# Altium footprint library ThanhNT.PcbLib: 579 footprints (part 20 of 37)
Each footprint in its own frame and in the unit in brackets; x right, y up, seen from the top. Pads: shape width x height; smd on the part's side, far side on the other; paste and mask are expansions set on the pad; w line width, h text height; cw(c..) or ccw(c..) is an arc to the next point about the centre after c.
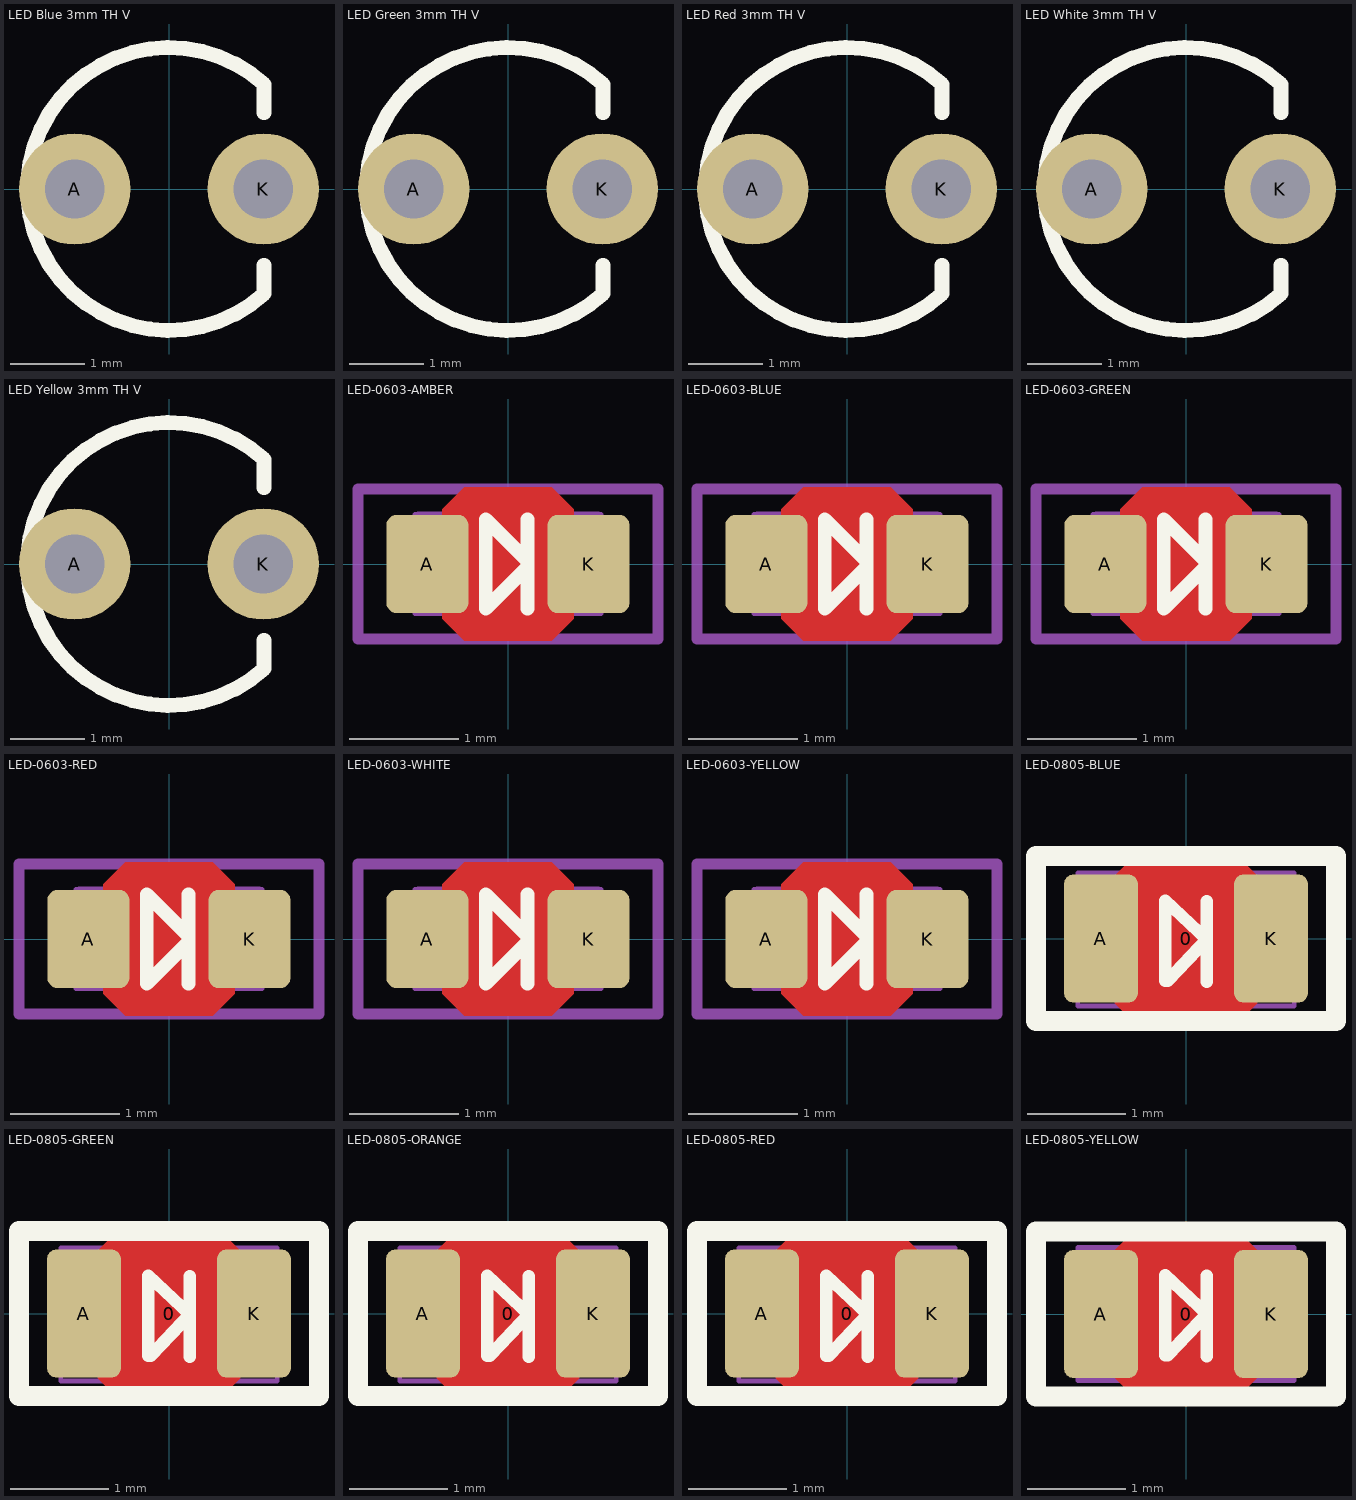
[diagram p19: the footprints below, top view; thin cyan lines are the x and y axes]

## LED Blue 3mm TH V [mm] "LED Blue 3mm TH V"
height 7.5
pads (2):
  round 1.5 hole 0.8: A(-1.27,0) K(1.27,0)
Top Overlay:
  lines w0.2: 1.281,-1.027 1.281,-1.41 cw(c0,0) 1.281,1.41 1.281,1.027
3D body "LED 3mm TH Blue.STEP": height 6.6, standoff -3.1, extent -1.6,-1.6 1.5,1.6

## LED Green 3mm TH V [mm] "LED Green 3mm TH V"
height 7.5
pads (2):
  round 1.5 hole 0.8: A(-1.27,0) K(1.27,0)
Top Overlay:
  lines w0.2: 1.281,-1.027 1.281,-1.41 cw(c0,0) 1.281,1.41 1.281,1.027
3D body "LED 3mm TH Green.STEP": height 6.6, standoff -3.1, extent -1.6,-1.6 1.5,1.6

## LED Red 3mm TH V [mm] "LED Red 3mm TH V"
height 7.5
pads (2):
  round 1.5 hole 0.8: A(-1.27,0) K(1.27,0)
Top Overlay:
  lines w0.2: 1.281,-1.027 1.281,-1.41 cw(c0,0) 1.281,1.41 1.281,1.027
3D body "LED 3mm TH Red.STEP": height 6.6, standoff -3.1, extent -1.6,-1.6 1.5,1.6

## LED White 3mm TH V [mm] "LED White 3mm TH V"
height 7.5
pads (2):
  round 1.5 hole 0.8: A(-1.27,0) K(1.27,0)
Top Overlay:
  lines w0.2: 1.281,-1.027 1.281,-1.41 cw(c0,0) 1.281,1.41 1.281,1.027
3D body "LED 3mm TH White.STEP": height 6.6, standoff -3.1, extent -1.6,-1.6 1.5,1.6

## LED Yellow 3mm TH V [mm] "LED Yellow 3mm TH V"
height 7.5
pads (2):
  round 1.5 hole 0.8: A(-1.27,0) K(1.27,0)
Top Overlay:
  lines w0.2: 1.281,-1.027 1.281,-1.41 cw(c0,0) 1.281,1.41 1.281,1.027
3D body "LED 3mm TH Yellow.STEP": height 6.6, standoff -3.1, extent -1.6,-1.6 1.5,1.6

## LED-0603-AMBER [mm]
height 0.8
pads (2):
  rrect25% 0.75x0.9 smd: A(-0.737,0) K(0.737,0)
Top Layer:
  pour cut-out: -0.6,0.5 -0.4,0.7 0.4,0.7 0.6,0.5 0.6,-0.5 0.4,-0.7 -0.4,-0.7 -0.6,-0.5
Top Overlay:
  lines w0.127: 0.178,-0.025 -0.203,-0.406 -0.203,0.406 0.178,0.025 0.178,-0.406 0.178,0.406
Mechanical 13:
  lines w0.05: -0.55,-0.43 0.55,-0.43 ; -0.55,0.43 0.55,0.43 ; -0.85,-0.45 -0.85,0.45 -0.55,0.45 -0.55,-0.45 -0.85,-0.45 ; 0.55,-0.45 0.55,0.45 0.85,0.45 0.85,-0.45 0.55,-0.45
Mechanical 15:
  lines w0.1: -1.372,-0.686 -1.372,0.686 1.372,0.686 1.372,-0.686 -1.372,-0.686
Mechanical 16:
  rectangle: 0.336,-0.472 0.836,0.478
  rectangle: -0.832,-0.472 -0.332,0.478
  lines w0.102: -0.35,-0.421 0.362,-0.421 ; -0.35,0.43 0.362,0.43
3D body "LED 0603 APT1608 AMBER.STEP": height 0.75, standoff 0, extent -0.8,-0.4 0.8,0.4

## LED-0603-BLUE [mm]
height 0.8
pads (2):
  rrect25% 0.75x0.9 smd: A(-0.737,0) K(0.737,0)
Top Layer:
  pour cut-out: -0.6,0.5 -0.4,0.7 0.4,0.7 0.6,0.5 0.6,-0.5 0.4,-0.7 -0.4,-0.7 -0.6,-0.5
Top Overlay:
  lines w0.127: 0.178,-0.025 -0.203,-0.406 -0.203,0.406 0.178,0.025 0.178,-0.406 0.178,0.406
Mechanical 13:
  lines w0.05: -0.55,-0.43 0.55,-0.43 ; -0.55,0.43 0.55,0.43 ; -0.85,-0.45 -0.55,-0.45 -0.55,0.45 -0.85,0.45 -0.85,-0.45 ; 0.55,-0.45 0.85,-0.45 0.85,0.45 0.55,0.45 0.55,-0.45
Mechanical 15:
  lines w0.1: -1.372,-0.686 1.372,-0.686 1.372,0.686 -1.372,0.686 -1.372,-0.686
Mechanical 16:
  rectangle: -0.832,-0.472 -0.332,0.478
  rectangle: 0.336,-0.472 0.836,0.478
  lines w0.102: -0.35,-0.421 0.362,-0.421 ; -0.35,0.43 0.362,0.43
3D body "LED 0603 APT1608 BLUE.STEP": height 0.75, standoff 0, extent -0.8,-0.4 0.8,0.4

## LED-0603-GREEN [mm]
height 0.8
pads (2):
  rrect25% 0.75x0.9 smd: A(-0.737,0) K(0.737,0)
Top Layer:
  pour cut-out: -0.6,0.5 -0.4,0.7 0.4,0.7 0.6,0.5 0.6,-0.5 0.4,-0.7 -0.4,-0.7 -0.6,-0.5
Top Overlay:
  lines w0.127: 0.178,-0.025 -0.203,-0.406 -0.203,0.406 0.178,0.025 0.178,-0.406 0.178,0.406
Mechanical 13:
  lines w0.05: -0.55,-0.43 0.55,-0.43 ; -0.55,0.43 0.55,0.43 ; -0.85,-0.45 -0.55,-0.45 -0.55,0.45 -0.85,0.45 -0.85,-0.45 ; 0.55,-0.45 0.85,-0.45 0.85,0.45 0.55,0.45 0.55,-0.45
Mechanical 15:
  lines w0.1: -1.372,-0.686 -1.372,0.686 1.372,0.686 1.372,-0.686 -1.372,-0.686
Mechanical 16:
  rectangle: -0.832,-0.472 -0.332,0.478
  rectangle: 0.336,-0.472 0.836,0.478
  lines w0.102: -0.35,-0.421 0.362,-0.421 ; -0.35,0.43 0.362,0.43
3D body "LED 0603 APT1608 GREEN.STEP": height 0.75, standoff 0, extent -0.8,-0.4 0.8,0.4

## LED-0603-RED [mm]
height 0.8
pads (2):
  rrect25% 0.75x0.9 smd: A(-0.737,0) K(0.737,0)
Top Layer:
  pour cut-out: -0.6,0.5 -0.4,0.7 0.4,0.7 0.6,0.5 0.6,-0.5 0.4,-0.7 -0.4,-0.7 -0.6,-0.5
Top Overlay:
  lines w0.127: 0.178,-0.025 -0.203,-0.406 -0.203,0.406 0.178,0.025 0.178,-0.406 0.178,0.406
Mechanical 13:
  lines w0.05: -0.55,-0.43 0.55,-0.43 ; -0.55,0.43 0.55,0.43 ; -0.85,-0.45 -0.85,0.45 -0.55,0.45 -0.55,-0.45 -0.85,-0.45 ; 0.55,-0.45 0.55,0.45 0.85,0.45 0.85,-0.45 0.55,-0.45
Mechanical 15:
  lines w0.1: -1.372,-0.686 -1.372,0.686 1.372,0.686 1.372,-0.686 -1.372,-0.686
Mechanical 16:
  rectangle: 0.336,-0.472 0.836,0.478
  rectangle: -0.832,-0.472 -0.332,0.478
  lines w0.102: -0.35,-0.421 0.362,-0.421 ; -0.35,0.43 0.362,0.43
3D body "LED 0603 APT1608 RED.STEP": height 0.75, standoff 0, extent -0.8,-0.4 0.8,0.4

## LED-0603-WHITE [mm]
height 0.8
pads (2):
  rrect25% 0.75x0.9 smd: A(-0.737,0) K(0.737,0)
Top Layer:
  pour cut-out: -0.6,0.5 -0.4,0.7 0.4,0.7 0.6,0.5 0.6,-0.5 0.4,-0.7 -0.4,-0.7 -0.6,-0.5
Top Overlay:
  lines w0.127: 0.178,-0.025 -0.203,-0.406 -0.203,0.406 0.178,0.025 0.178,-0.406 0.178,0.406
Mechanical 13:
  lines w0.05: -0.55,-0.43 0.55,-0.43 ; -0.55,0.43 0.55,0.43 ; -0.85,-0.45 -0.55,-0.45 -0.55,0.45 -0.85,0.45 -0.85,-0.45 ; 0.55,-0.45 0.85,-0.45 0.85,0.45 0.55,0.45 0.55,-0.45
Mechanical 15:
  lines w0.1: -1.372,-0.686 1.372,-0.686 1.372,0.686 -1.372,0.686 -1.372,-0.686
Mechanical 16:
  rectangle: -0.832,-0.472 -0.332,0.478
  rectangle: 0.336,-0.472 0.836,0.478
  lines w0.102: -0.35,-0.421 0.362,-0.421 ; -0.35,0.43 0.362,0.43
3D body "LED 0603 APT1608 WHITE.STEP": height 0.75, standoff 0, extent -0.8,-0.4 0.8,0.4

## LED-0603-YELLOW [mm]
height 0.8
pads (2):
  rrect25% 0.75x0.9 smd: A(-0.737,0) K(0.737,0)
Top Layer:
  pour cut-out: -0.6,0.5 -0.4,0.7 0.4,0.7 0.6,0.5 0.6,-0.5 0.4,-0.7 -0.4,-0.7 -0.6,-0.5
Top Overlay:
  lines w0.127: 0.178,-0.025 -0.203,-0.406 -0.203,0.406 0.178,0.025 0.178,-0.406 0.178,0.406
Mechanical 13:
  lines w0.05: -0.55,-0.43 0.55,-0.43 ; -0.55,0.43 0.55,0.43 ; -0.85,-0.45 -0.85,0.45 -0.55,0.45 -0.55,-0.45 -0.85,-0.45 ; 0.55,-0.45 0.55,0.45 0.85,0.45 0.85,-0.45 0.55,-0.45
Mechanical 15:
  lines w0.1: -1.372,-0.686 -1.372,0.686 1.372,0.686 1.372,-0.686 -1.372,-0.686
Mechanical 16:
  rectangle: 0.336,-0.472 0.836,0.478
  rectangle: -0.832,-0.472 -0.332,0.478
  lines w0.102: -0.35,-0.421 0.362,-0.421 ; -0.35,0.43 0.362,0.43
3D body "LED 0603 APT1608 YELLOW.STEP": height 0.75, standoff 0, extent -0.8,-0.4 0.8,0.4

## LED-0805-BLUE [mm] "LED SMD, Body 2.0x1.2mm, EIA 0805, IPC Medium Density"
height 0.7
pads (3):
  round 0.254 on Mech15: 0(0,0)
  rrect25% 0.75x1.3 smd: A(-0.864,0) K(0.864,0)
Top Layer:
  pour cut-out: -0.725,0.64 -0.525,0.84 0.525,0.84 0.725,0.64 0.725,-0.66 0.525,-0.86 -0.525,-0.86 -0.725,-0.66
Top Overlay:
  lines w0.127: -0.21,-0.43 -0.21,0.385 0.21,-0.01 -0.185,-0.43 ; 0.21,-0.44 0.21,0.38
  lines w0.2: -1.524,-0.838 1.524,-0.838 1.524,0.838 -1.524,0.838 -1.524,-0.838
Mechanical 13:
  lines w0.05: 0.6,-0.684 -0.6,-0.684 ; -0.6,-0.684 0.6,-0.684 ; -0.6,-0.685 -1.1,-0.685 -1.1,0.665 -0.6,0.665 -0.6,-0.685 ; 0.6,-0.685 1.1,-0.685 1.1,0.665 0.6,0.665 0.6,-0.685 ; -0.6,0.664 0.6,0.664 -0.6,0.664
Mechanical 15:
  lines w0.1: -1.524,-0.85 -1.524,0.85 1.524,0.85 1.524,-0.85 -1.524,-0.85
3D body "User Library-led_0805-blue.step": height 1.1, standoff 0, extent -1.01,-0.625 1.01,0.625

## LED-0805-GREEN [mm] "LED SMD, Body 2.0x1.2mm, EIA 0805, IPC Medium Density"
height 0.7
pads (3):
  round 0.254 on Mech15: 0(0,0)
  rrect25% 0.75x1.3 smd: A(-0.864,0) K(0.864,0)
Top Layer:
  pour cut-out: -0.725,0.64 -0.525,0.84 0.525,0.84 0.725,0.64 0.725,-0.66 0.525,-0.86 -0.525,-0.86 -0.725,-0.66
Top Overlay:
  lines w0.127: -0.21,-0.43 -0.21,0.385 0.21,-0.01 -0.185,-0.43 ; 0.21,-0.44 0.21,0.38
  lines w0.2: -1.524,-0.838 -1.524,0.838 1.524,0.838 1.524,-0.838 -1.524,-0.838
Mechanical 13:
  lines w0.05: 0.6,-0.684 -0.6,-0.684 ; -0.6,-0.685 -0.6,0.665 -1.1,0.665 -1.1,-0.685 -0.6,-0.685 ; -0.6,-0.684 0.6,-0.684 ; 0.6,-0.685 0.6,0.665 1.1,0.665 1.1,-0.685 0.6,-0.685 ; -0.6,0.664 0.6,0.664 -0.6,0.664
Mechanical 15:
  lines w0.1: -1.524,-0.85 1.524,-0.85 1.524,0.85 -1.524,0.85 -1.524,-0.85
3D body "User Library-led_0805-Green.step": height 1.1, standoff 0, extent -1.01,-0.625 1.01,0.625

## LED-0805-ORANGE [mm] "LED SMD, Body 2.0x1.2mm, EIA 0805, IPC Medium Density"
height 0.7
pads (3):
  round 0.254 on Mech15: 0(0,0)
  rrect25% 0.75x1.3 smd: A(-0.864,0) K(0.864,0)
Top Layer:
  pour cut-out: -0.725,0.64 -0.525,0.84 0.525,0.84 0.725,0.64 0.725,-0.66 0.525,-0.86 -0.525,-0.86 -0.725,-0.66
Top Overlay:
  lines w0.127: -0.21,-0.43 -0.21,0.385 0.21,-0.01 -0.185,-0.43 ; 0.21,-0.44 0.21,0.38
  lines w0.2: -1.524,-0.838 1.524,-0.838 1.524,0.838 -1.524,0.838 -1.524,-0.838
Mechanical 13:
  lines w0.05: 0.6,-0.684 -0.6,-0.684 ; -0.6,-0.684 0.6,-0.684 ; -0.6,-0.685 -1.1,-0.685 -1.1,0.665 -0.6,0.665 -0.6,-0.685 ; 0.6,-0.685 1.1,-0.685 1.1,0.665 0.6,0.665 0.6,-0.685 ; -0.6,0.664 0.6,0.664 -0.6,0.664
Mechanical 15:
  lines w0.1: -1.524,-0.85 -1.524,0.85 1.524,0.85 1.524,-0.85 -1.524,-0.85
3D body "User Library-led_0805-orange.step": height 1.1, standoff 0, extent -1.01,-0.635 1.01,0.615

## LED-0805-RED [mm] "LED SMD, Body 2.0x1.2mm, EIA 0805, IPC Medium Density"
height 0.7
pads (3):
  round 0.254 on Mech15: 0(0,0)
  rrect25% 0.75x1.3 smd: A(-0.864,0) K(0.864,0)
Top Layer:
  pour cut-out: -0.725,0.64 -0.525,0.84 0.525,0.84 0.725,0.64 0.725,-0.66 0.525,-0.86 -0.525,-0.86 -0.725,-0.66
Top Overlay:
  lines w0.127: -0.21,-0.43 -0.21,0.385 0.21,-0.01 -0.185,-0.43 ; 0.21,-0.44 0.21,0.38
  lines w0.2: -1.524,-0.838 -1.524,0.838 1.524,0.838 1.524,-0.838 -1.524,-0.838
Mechanical 13:
  lines w0.05: 0.6,-0.684 -0.6,-0.684 ; -0.6,-0.685 -0.6,0.665 -1.1,0.665 -1.1,-0.685 -0.6,-0.685 ; -0.6,-0.684 0.6,-0.684 ; 0.6,-0.685 0.6,0.665 1.1,0.665 1.1,-0.685 0.6,-0.685 ; -0.6,0.664 0.6,0.664 -0.6,0.664
Mechanical 15:
  lines w0.1: -1.524,-0.85 1.524,-0.85 1.524,0.85 -1.524,0.85 -1.524,-0.85
3D body "User Library-led_0805-red.step": height 1.1, standoff 0, extent -1.01,-0.625 1.01,0.625

## LED-0805-YELLOW [mm] "LED SMD, Body 2.0x1.2mm, EIA 0805, IPC Medium Density"
height 0.7
pads (3):
  round 0.254 on Mech15: 0(0,0)
  rrect25% 0.75x1.3 smd: A(-0.864,0) K(0.864,0)
Top Layer:
  pour cut-out: -0.725,0.65 -0.525,0.85 0.525,0.85 0.725,0.65 0.725,-0.65 0.525,-0.85 -0.525,-0.85 -0.725,-0.65
Top Overlay:
  lines w0.127: -0.21,-0.42 -0.21,0.395 0.21,0 -0.185,-0.42 ; 0.21,-0.43 0.21,0.39
  lines w0.2: -1.524,-0.838 1.524,-0.838 1.524,0.838 -1.524,0.838 -1.524,-0.838
Mechanical 13:
  lines w0.05: 0.6,-0.674 -0.6,-0.674 ; -0.6,-0.675 -0.6,0.675 -1.1,0.675 -1.1,-0.675 -0.6,-0.675 ; -0.6,-0.674 0.6,-0.674 ; 0.6,-0.675 0.6,0.675 ; 0.6,-0.675 1.1,-0.675 1.1,0.675 0.6,0.675 ; 0.6,0.674 -0.6,0.674 0.6,0.674
Mechanical 15:
  lines w0.1: -1.524,-0.85 -1.524,0.85 1.524,0.85 1.524,-0.85 -1.524,-0.85
3D body "User Library-led_0805-yellow.step": height 1.1, standoff 0, extent -1.01,-0.635 1.01,0.615